# Altium footprint library JL_PCB.PCBLIB: 1129 footprints (part 28 of 72)
Each footprint in its own frame and in the unit in brackets; x right, y up, seen from the top. Pads: shape width x height; smd on the part's side, far side on the other; paste and mask are expansions set on the pad; w line width, h text height; cw(c..) or ccw(c..) is an arc to the next point about the centre after c.
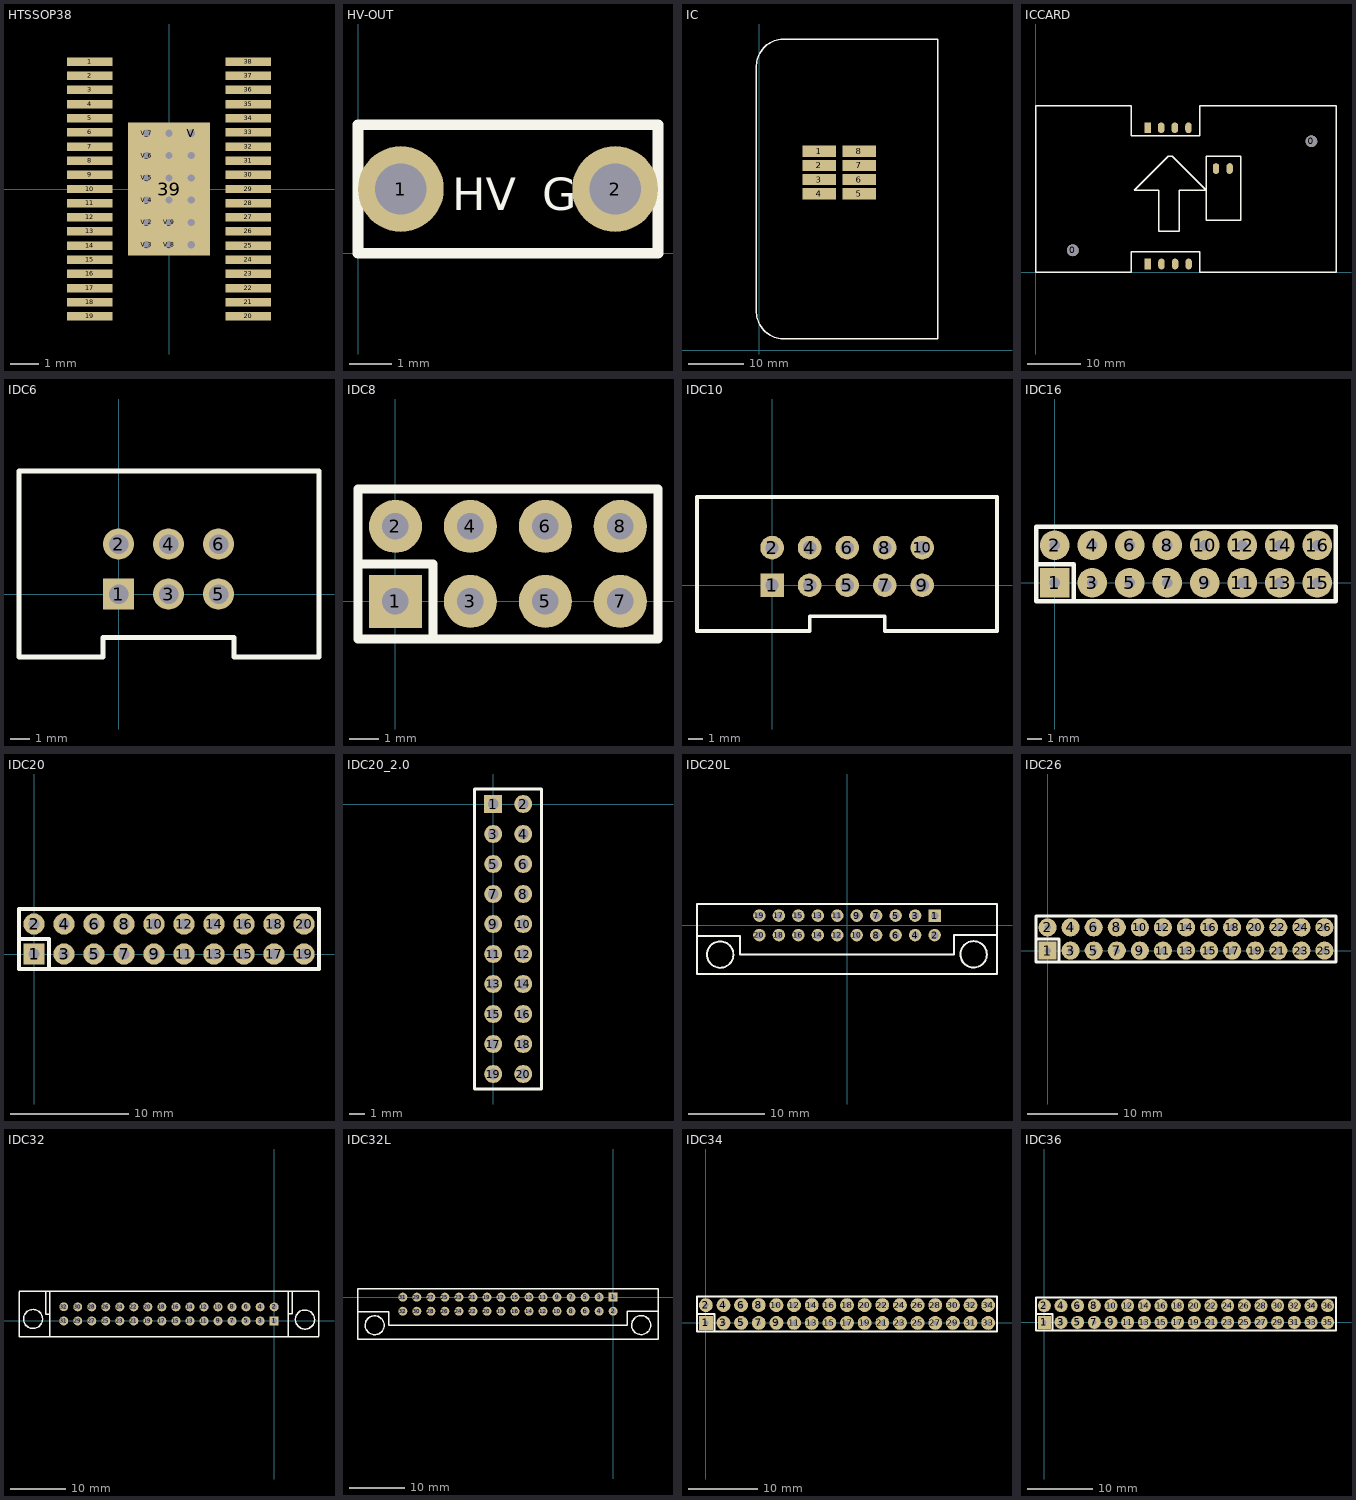
[diagram p27: the footprints below, top view; thin cyan lines are the x and y axes]

## HTSSOP38 [mm] "DRV8711"
pads (57):
  rect 1.6x0.3 smd paste-0.15: 1(-2.8,4.5) 2(-2.8,4) 3(-2.8,3.5) 4(-2.8,3) 5(-2.8,2.5) 6(-2.8,2) 7(-2.8,1.5) 8(-2.8,1) 9(-2.8,0.5) 10(-2.8,0) 11(-2.8,-0.5) 12(-2.8,-1) 13(-2.8,-1.5) 14(-2.8,-2) 15(-2.8,-2.5) 16(-2.8,-3) 17(-2.8,-3.5) 18(-2.8,-4) 19(-2.8,-4.5) 20(2.8,-4.5) 21(2.8,-4) 22(2.8,-3.5) 23(2.8,-3) 24(2.8,-2.5) 25(2.8,-2) 26(2.8,-1.5) 27(2.8,-1) 28(2.8,-0.5) 29(2.8,0) 30(2.8,0.5) 31(2.8,1) 32(2.8,1.5) 33(2.8,2) 34(2.8,2.5) 35(2.8,3) 36(2.8,3.5) 37(2.8,4) 38(2.8,4.5)
  rect 2.9x4.7 smd paste-2.337 mask-2.337: 39(0,0)
  round 0.508 / inner round 1.524 / far side round 0.508 hole 0.254: V(0.787,1.968) V_2(-0.787,-1.181) V_3(-0.787,-1.968) V_4(-0.787,-0.394) V_5(-0.787,0.394) V_6(-0.787,1.181) V_7(-0.787,1.968) V_8(0,-1.968) V_9(0,-1.181) V_10(0,-0.394) V_11(0,0.394) V_12(0,1.181) V_13(0,1.968) V_14(0.787,-1.968) V_15(0.787,-1.181) V_16(0.787,-0.394) V_17(0.787,0.394) V_18(0.787,1.181)
TopOverlay:
  text "." at -2.921,4.826 h2.54
TopPaste:
  drawing of 66 lines, arcs and shapes, not listed
TopSolder:
  drawing of 51 lines, arcs and shapes, not listed

## HV-OUT [mm]
pads (2):
  round 2 hole 1.2: 1(1,1.5) 2(6,1.5)
TopOverlay:
  lines w0.254: 0,0 0,3 7,3 7,0 0,0
  text "HV" at 2.2,1 h0.76
  text "G" at 4.3,1 h0.76

## IC [mm]
pads (8):
  rect 6x2 smd: 1(10.746,35.736) 2(10.746,33.196) 3(10.746,30.656) 4(10.746,28.116) 5(17.886,28.116) 6(17.886,30.656) 7(17.886,33.196) 8(17.886,35.736)
TopOverlay:
  lines w0.254: -0.559,50.76 cw(c4.44,50.882) 4.572,55.88 32.004,55.88 32.004,2.032 4.572,2.032 cw(c4.45,7.031) -0.548,7.163 -0.559,50.76

## ICCARD [mm] "IC?"
pads (12):
  round 2.2 hole 2.1: 0(6.858,4.064) 0(51.308,24.384)
  rect 1.2x2 smd: 1(20.777,26.899) 5(20.828,1.524)
  oval 1.2x2 smd: 2(23.317,26.899) 3(25.857,26.899) 4(28.397,26.899) 6(23.368,1.524) 7(25.908,1.524) 8(28.448,1.524) 9(33.528,19.304) 10(36.068,19.304)
TopOverlay:
  lines w0.254: 0,0 17.78,0 17.78,3.81 30.48,3.81 30.48,0 55.88,0 55.88,30.988 30.48,30.988 30.48,25.4 17.78,25.4 17.78,30.988 0,30.988 0,0 ; 18.288,15.24 22.86,15.24 22.86,7.62 26.67,7.62 26.67,15.24 31.75,15.24 25.4,21.59 24.638,21.59 18.288,15.24 ; 31.75,9.652 31.75,21.59 38.1,21.59 38.1,9.652 31.75,9.652
3D body: height 0.1, standoff 0, extent 31.751,9.653 38.099,21.589
3D body: height 2.1, standoff 0, extent 18.286,7.62 31.75,21.591
3D body: height 2, standoff 0, extent 0.001,0.001 55.879,30.987

## IDC6 [mil]
pads (6):
  rect 62x62 hole 39: 1(0,0)
  round 62 hole 39: 2(0,100) 3(100,0) 4(100,100) 5(200,0) 6(200,100)
TopOverlay:
  lines w10: -198.98,-125.98 -31.5,-125.98 -31.5,-86.61 231.5,-86.61 231.5,-125.98 400.98,-125.98 401,246 -199,246 -199,-126
3D body "IDC6.STEP": height 358.27, standoff -122.05, extent -199,-126.05 401,246

## IDC8 [mm]
pads (8):
  rect 1.8x1.8 hole 0.9: 1(0,0)
  round 1.8 hole 0.9: 2(0,2.54) 3(2.54,0) 4(2.54,2.54) 5(5.08,0) 6(5.08,2.54) 7(7.62,0) 8(7.62,2.54)
TopOverlay:
  lines w0.305: -1.27,1.27 1.27,1.27 1.27,-1.27 ; 8.89,-1.27 -1.27,-1.27 -1.27,3.81 8.9,3.8 8.9,-1.28
3D body "User Library-8 pin IDC shrouded header V2.step": height 9.02, standoff -3.13, extent -5.055,-3.429 12.725,5.771

## IDC10 [mm]
pads (10):
  rect 1.6x1.6 hole 0.9: 1(0,0)
  round 1.6 hole 0.9: 2(0,2.54) 3(2.54,0) 4(2.54,2.54) 5(5.08,0) 6(5.08,2.54) 7(7.62,0) 8(7.62,2.54) 9(10.16,0) 10(10.16,2.54)
TopOverlay:
  lines w0.254: -5.08,5.385 -5.08,5.969 15.215,5.969 15.215,-3.099 15.213,-3.1 7.62,-3.1 7.62,-2.1 2.54,-2.1 2.54,-3.1 -5.079,-3.1 -5.08,-3.099 -5.08,5.563
3D body "User Library-IDC-10M.STEP": height 9.3, standoff -3.1, extent -5.07,-3.131 15.23,5.969

## IDC16 [mm]
pads (16):
  rect 2x2 hole 0.711: 1(0,0)
  round 2 hole 0.711: 2(0,2.54) 3(2.54,0) 4(2.54,2.54) 5(5.08,0) 6(5.08,2.54) 7(7.62,0) 8(7.62,2.54) 9(10.16,0) 10(10.16,2.54) 11(12.7,0) 12(12.7,2.54) 13(15.24,0) 14(15.24,2.54) 15(17.78,0) 16(17.78,2.54)
TopOverlay:
  lines w0.305: -1.27,1.27 1.27,1.27 1.27,-1.27 ; -1.27,-1.27 19.05,-1.27 19.05,3.81 -1.27,3.81 -1.27,-1.27

## IDC20 [mm]
pads (20):
  rect 1.8x1.8 hole 0.9: 1(0,0)
  round 1.8 hole 0.9: 2(0,2.54) 3(2.54,0) 4(2.54,2.54) 5(5.08,0) 6(5.08,2.54) 7(7.62,0) 8(7.62,2.54) 9(10.16,0) 10(10.16,2.54) 11(12.7,0) 12(12.7,2.54) 13(15.24,0) 14(15.24,2.54) 15(17.78,0) 16(17.78,2.54) 17(20.32,0) 18(20.32,2.54) 19(22.86,0) 20(22.86,2.54)
TopOverlay:
  lines w0.305: -1.27,1.27 1.27,1.27 1.27,-1.27 ; -1.27,-1.27 24.13,-1.27 24.13,3.81 -1.27,3.81 -1.27,-1.27

## IDC20_2.0 [mm]
pads (20):
  rect 1.2x1.2 hole 0.7: 1(0,0)
  round 1.2 hole 0.7: 2(2,0) 3(0,-2) 4(2,-2) 5(0,-4) 6(2,-4) 7(0,-6) 8(2,-6) 9(0,-8) 10(2,-8) 11(0,-10) 12(2,-10) 13(0,-12) 14(2,-12) 15(0,-14) 16(2,-14) 17(0,-16) 18(2,-16) 19(0,-18) 20(2,-18)
TopOverlay:
  lines w0.2: 0.5,1 3.213,1 3.213,-19 -1.238,-19 -1.238,1 1.5,1

## IDC20L [mm]
pads (20):
  rect 1.618x1.618 hole 1: 1(11.43,1.27)
  round 1.618 hole 1: 2(11.43,-1.27) 3(8.89,1.27) 4(8.89,-1.27) 5(6.35,1.27) 6(6.35,-1.27) 7(3.81,1.27) 8(3.81,-1.27) 9(1.27,1.27) 10(1.27,-1.27) 11(-1.27,1.27) 12(-1.27,-1.27) 13(-3.81,1.27) 14(-3.81,-1.27) 15(-6.35,1.27) 16(-6.35,-1.27) 17(-8.89,1.27) 18(-8.89,-1.27) 19(-11.43,1.27) 20(-11.43,-1.27)
TopOverlay:
  lines w0.254: -14.814,-3.858 cw(c-16.535,-3.81) -14.814,-3.81 ; 18.231,-3.833 cw(c16.51,-3.785) 18.232,-3.785 ; -19.558,-1.397 -19.558,-6.35 19.558,-6.35 19.558,-1.27 ; -19.558,-1.397 -13.97,-1.397 -13.97,-3.81 13.97,-3.81 13.97,-1.27 19.558,-1.27 ; -19.558,-1.397 -19.558,2.794 19.558,2.794 19.558,-1.27

## IDC26 [mm]
pads (26):
  rect 2x2 hole 0.711: 1(0,0)
  round 2 hole 0.711: 2(0,2.54) 3(2.54,0) 4(2.54,2.54) 5(5.08,0) 6(5.08,2.54) 7(7.62,0) 8(7.62,2.54) 9(10.16,0) 10(10.16,2.54) 11(12.7,0) 12(12.7,2.54) 13(15.24,0) 14(15.24,2.54) 15(17.78,0) 16(17.78,2.54) 17(20.32,0) 18(20.32,2.54) 19(22.86,0) 20(22.86,2.54) 21(25.4,0) 22(25.4,2.54) 23(27.94,0) 24(27.94,2.54) 25(30.48,0) 26(30.48,2.54)
TopOverlay:
  lines w0.305: -1.27,1.27 1.27,1.27 1.27,-1.27 ; -1.27,-1.27 -1.27,3.81 31.75,3.81 31.75,-1.27 -1.27,-1.27

## IDC32 [mm]
pads (32):
  rect 1.618x1.618 hole 1: 1(0,0)
  round 1.618 hole 1: 2(0,2.54) 3(-2.54,0) 4(-2.54,2.54) 5(-5.08,0) 6(-5.08,2.54) 7(-7.62,0) 8(-7.62,2.54) 9(-10.16,0) 10(-10.16,2.54) 11(-12.7,0) 12(-12.7,2.54) 13(-15.24,0) 14(-15.24,2.54) 15(-17.78,0) 16(-17.78,2.54) 17(-20.32,0) 18(-20.32,2.54) 19(-22.86,0) 20(-22.86,2.54) 21(-25.4,0) 22(-25.4,2.54) 23(-27.94,0) 24(-27.94,2.54) 25(-30.48,0) 26(-30.48,2.54) 27(-33.02,0) 28(-33.02,2.54) 29(-35.56,0) 30(-35.56,2.54) 31(-38.1,0) 32(-38.1,2.565)
TopOverlay:
  lines w0.254: -46.203,5.309 -46.203,-2.819 8.103,-2.819 ; -46.177,5.334 8.128,5.334 8.128,-2.794 ; -41.942,0.307 cw(c-43.663,0.356) -41.941,0.356 ; -41.377,5.309 -41.377,1.245 -40.615,1.245 ; -40.615,-2.819 -40.615,5.182 ; 2.54,-2.794 2.54,5.207 ; 2.54,1.27 3.302,1.27 3.302,5.334 ; 7.314,0.2 cw(c5.588,0.254) 7.315,0.278

## IDC32L [mm]
pads (32):
  rect 1.618x1.618 hole 1: 1(0,0)
  round 1.618 hole 1: 2(0,-2.54) 3(-2.54,0) 4(-2.54,-2.54) 5(-5.08,0) 6(-5.08,-2.54) 7(-7.62,0) 8(-7.62,-2.54) 9(-10.16,0) 10(-10.16,-2.54) 11(-12.7,0) 12(-12.7,-2.54) 13(-15.24,0) 14(-15.24,-2.54) 15(-17.78,0) 16(-17.78,-2.54) 17(-20.32,0) 18(-20.32,-2.54) 19(-22.86,0) 20(-22.86,-2.54) 21(-25.4,0) 22(-25.4,-2.54) 23(-27.94,0) 24(-27.94,-2.54) 25(-30.48,0) 26(-30.48,-2.54) 27(-33.02,0) 28(-33.02,-2.54) 29(-35.56,0) 30(-35.56,-2.54) 31(-38.1,0) 32(-38.1,-2.54)
TopOverlay:
  lines w0.254: -41.484,-5.128 cw(c-43.205,-5.08) -41.484,-5.08 ; -30.988,1.524 8.128,1.524 8.128,-2.54 ; -30.836,1.524 -46.228,1.524 -46.228,-2.667 ; 6.801,-5.103 cw(c5.08,-5.055) 6.802,-5.055 ; -46.228,-2.667 -46.228,-7.62 -30.988,-7.62 8.128,-7.62 8.128,-2.54 ; -46.228,-2.667 -40.64,-2.667 -40.64,-5.08 -25.4,-5.08 2.54,-5.08 2.54,-2.54 8.128,-2.54

## IDC34 [mm]
pads (34):
  rect 2x2 hole 0.711: 1(0,0)
  round 2 hole 0.711: 2(0,2.54) 3(2.54,0) 4(2.54,2.54) 5(5.08,0) 6(5.08,2.54) 7(7.62,0) 8(7.62,2.54) 9(10.16,0) 10(10.16,2.54) 11(12.7,0) 12(12.7,2.54) 13(15.24,0) 14(15.24,2.54) 15(17.78,0) 16(17.78,2.54) 17(20.32,0) 18(20.32,2.54) 19(22.86,0) 20(22.86,2.54) 21(25.4,0) 22(25.4,2.54) 23(27.94,0) 24(27.94,2.54) 25(30.48,0) 26(30.48,2.54) 27(33.02,0) 28(33.02,2.54) 29(35.56,0) 30(35.56,2.54) 31(38.1,0) 32(38.1,2.54) 33(40.64,0) 34(40.64,2.54)
TopOverlay:
  lines w0.305: -1.27,1.27 1.27,1.27 1.27,-1.27 ; -1.27,-1.27 41.91,-1.27 41.91,3.81 -1.27,3.81 -1.27,-1.27

## IDC36 [mm]
pads (36):
  rect 2x2 hole 0.711: 1(0,0)
  round 2 hole 0.711: 2(0,2.54) 3(2.54,0) 4(2.54,2.54) 5(5.08,0) 6(5.08,2.54) 7(7.62,0) 8(7.62,2.54) 9(10.16,0) 10(10.16,2.54) 11(12.7,0) 12(12.7,2.54) 13(15.24,0) 14(15.24,2.54) 15(17.78,0) 16(17.78,2.54) 17(20.32,0) 18(20.32,2.54) 19(22.86,0) 20(22.86,2.54) 21(25.4,0) 22(25.4,2.54) 23(27.94,0) 24(27.94,2.54) 25(30.48,0) 26(30.48,2.54) 27(33.02,0) 28(33.02,2.54) 29(35.56,0) 30(35.56,2.54) 31(38.1,0) 32(38.1,2.54) 33(40.64,0) 34(40.64,2.54) 35(43.18,0) 36(43.18,2.54)
TopOverlay:
  lines w0.305: -1.27,1.27 1.27,1.27 1.27,-1.27 ; -1.27,-1.27 -1.27,3.81 44.45,3.81 44.45,-1.27 -1.27,-1.27